# Altium footprint library EXPLORER.PcbLib: 252 footprints (part 11 of 16)
Each footprint in its own frame and in the unit in brackets; x right, y up, seen from the top. Pads: shape width x height; smd on the part's side, far side on the other; paste and mask are expansions set on the pad; w line width, h text height; cw(c..) or ccw(c..) is an arc to the next point about the centre after c.
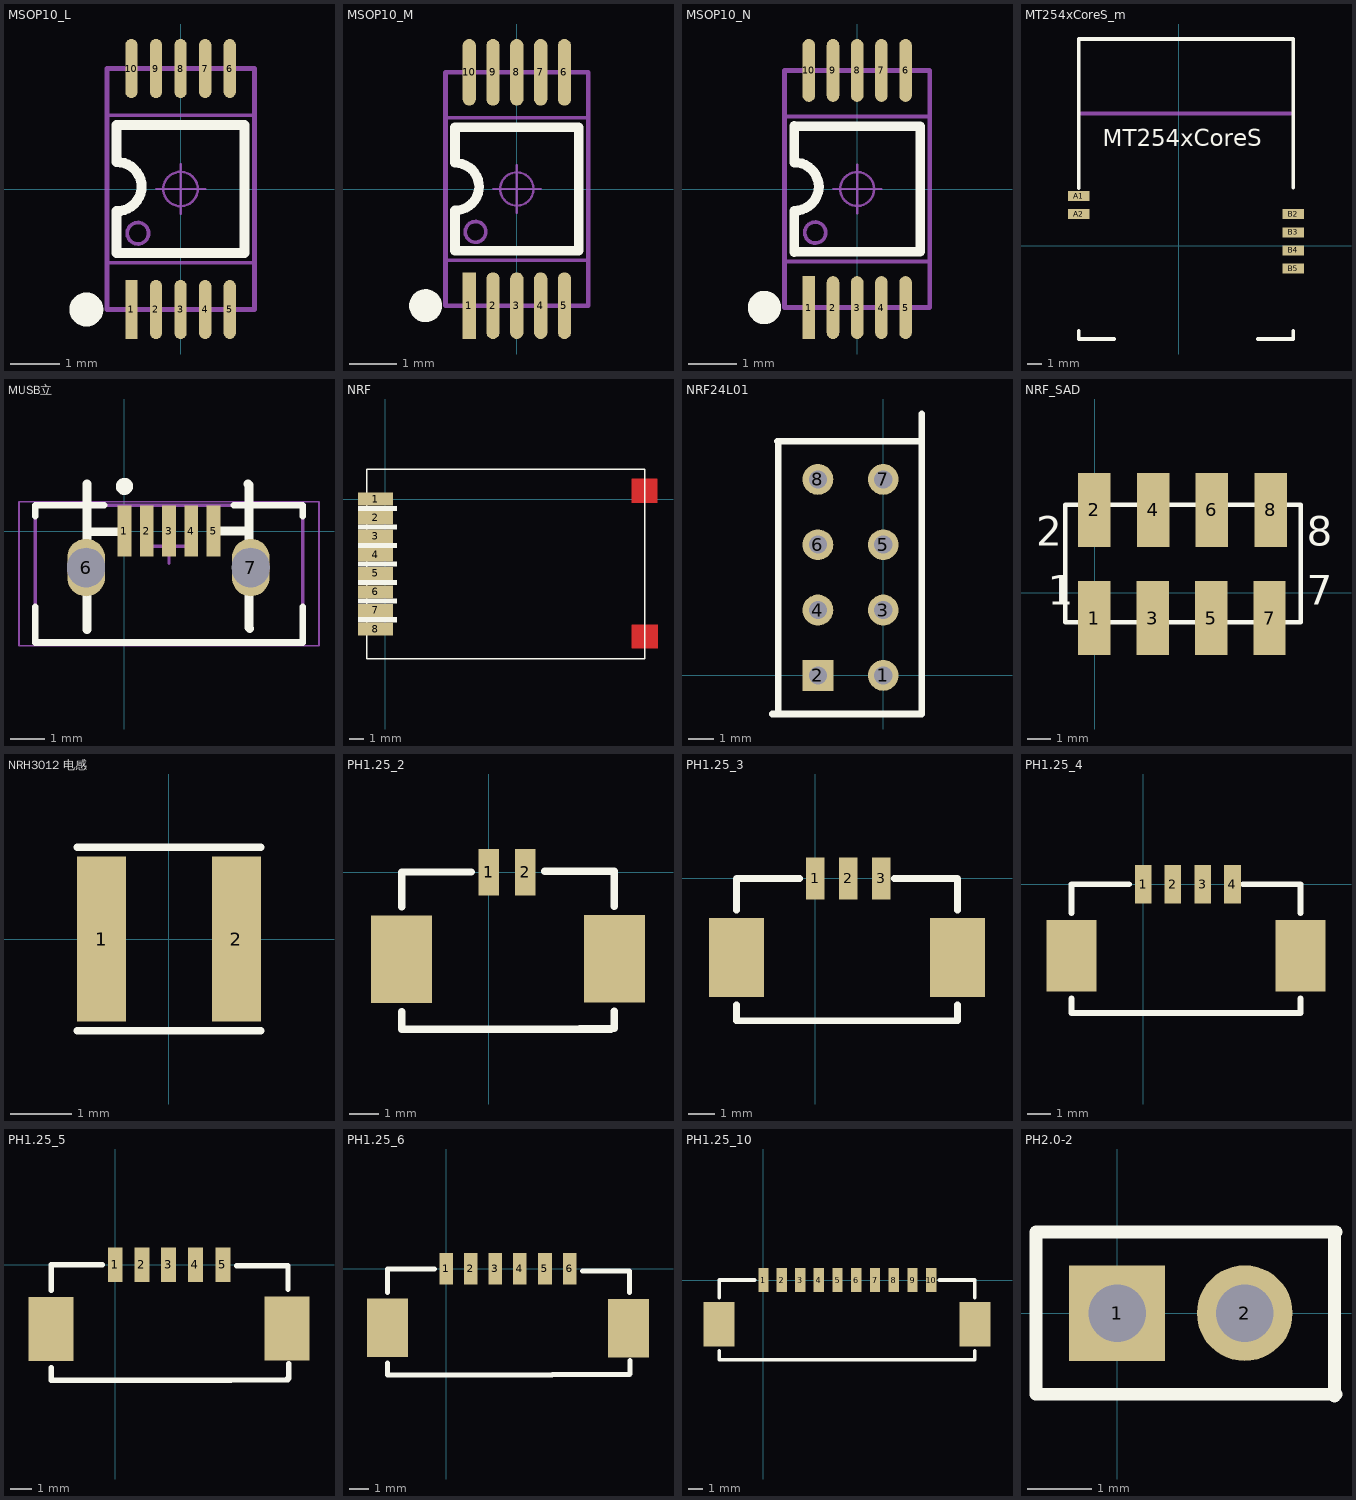
[diagram p10: the footprints below, top view; thin cyan lines are the x and y axes]

## MSOP10_L [mm] "塑封体长3mm，宽3mm，脚距0.5"
pads (10):
  rect 0.25x1.2 smd: 1(-1,-2.45)
  oval 0.25x1.2 smd: 2(-0.5,-2.45) 3(0,-2.45) 4(0.5,-2.45) 5(1,-2.45) 6(1,2.45) 7(0.5,2.45) 8(0,2.45) 9(-0.5,2.45) 10(-1,2.45)
Top Overlay:
  circle w0.381: c-1.917,-2.45 r0.155
  lines w0.2: -1.3,-1.3 1.3,-1.3 1.3,1.3 -1.3,1.3
  lines w0.203: -1.3,-1.3 -1.3,-0.46 ; -1.3,-0.45 ccw(c-1.3,0.058) -0.792,0.058 ; -1.3,0.55 cw(c-1.3,0.042) -0.792,0.042 ; -1.3,0.556 -1.3,1.3
Mechanical 13:
  circle w0.076: c-0.867,-0.9 r0.217
  lines w0.076: -1.5,-1.5 -1.5,1.5 1.5,1.5 1.5,-1.5 -1.5,-1.5
Mechanical 15:
  circle w0.05: c0,0 r0.35
  lines w0.05: -0.5,0 0.5,0 ; 0,-0.5 0,0.5
  lines w0.1: -1.5,-2.45 1.5,-2.45 1.5,2.45 -1.5,2.45 -1.5,-2.45
3D body: height 0.95, standoff 0, extent -1.5,-2.45 1.5,2.45

## MSOP10_M [mm] "塑封体长3mm，宽3mm，脚距0.5"
pads (10):
  rect 0.28x1.4 smd: 1(-1,-2.45)
  oval 0.28x1.4 smd: 2(-0.5,-2.45) 3(0,-2.45) 4(0.5,-2.45) 5(1,-2.45) 6(1,2.45) 7(0.5,2.45) 8(0,2.45) 9(-0.5,2.45) 10(-1,2.45)
Top Overlay:
  circle w0.381: c-1.917,-2.45 r0.155
  lines w0.2: -1.3,-1.3 1.3,-1.3 1.3,1.3 -1.3,1.3
  lines w0.203: -1.3,-1.3 -1.3,-0.46 ; -1.3,-0.45 ccw(c-1.3,0.058) -0.792,0.058 ; -1.3,0.55 cw(c-1.3,0.042) -0.792,0.042 ; -1.3,0.556 -1.3,1.3
Mechanical 13:
  circle w0.076: c-0.867,-0.9 r0.217
  lines w0.076: -1.5,-1.5 -1.5,1.5 1.5,1.5 1.5,-1.5 -1.5,-1.5
Mechanical 15:
  circle w0.05: c0,0 r0.35
  lines w0.05: -0.5,0 0.5,0 ; 0,-0.5 0,0.5
  lines w0.1: -1.5,-2.45 1.5,-2.45 1.5,2.45 -1.5,2.45 -1.5,-2.45
3D body: height 0.95, standoff 0, extent -1.5,-2.45 1.5,2.45

## MSOP10_N [mm] "塑封体长3mm，宽3mm，脚距0.5"
pads (10):
  rect 0.26x1.3 smd: 1(-1,-2.45)
  oval 0.26x1.3 smd: 2(-0.5,-2.45) 3(0,-2.45) 4(0.5,-2.45) 5(1,-2.45) 6(1,2.45) 7(0.5,2.45) 8(0,2.45) 9(-0.5,2.45) 10(-1,2.45)
Top Overlay:
  circle w0.381: c-1.917,-2.45 r0.155
  lines w0.2: -1.3,-1.3 1.3,-1.3 1.3,1.3 -1.3,1.3
  lines w0.203: -1.3,-1.3 -1.3,-0.46 ; -1.3,-0.45 ccw(c-1.3,0.058) -0.792,0.058 ; -1.3,0.55 cw(c-1.3,0.042) -0.792,0.042 ; -1.3,0.556 -1.3,1.3
Mechanical 13:
  circle w0.076: c-0.867,-0.9 r0.217
  lines w0.076: -1.5,-1.5 -1.5,1.5 1.5,1.5 1.5,-1.5 -1.5,-1.5
Mechanical 15:
  circle w0.05: c0,0 r0.35
  lines w0.05: -0.5,0 0.5,0 ; 0,-0.5 0,0.5
  lines w0.1: -1.5,-2.45 1.5,-2.45 1.5,2.45 -1.5,2.45 -1.5,-2.45
3D body: height 0.95, standoff 0, extent -1.5,-2.45 1.5,2.45

## MT254xCoreS_m [mm] "CC2540/41-PCB-SMT-package"
height 1.6
pads (6):
  rect 1.5x0.7 smd: A1(-6.992,3.48) A2(-6.992,2.21) B2(8.008,2.21) B3(8.008,0.94) B4(8.008,-0.33) B5(8.008,-1.6)
Top Overlay:
  lines w0.254: -6.992,-5.969 -6.992,-6.528 -4.503,-6.528 ; -6.992,4.039 -6.992,14.472 8.008,14.472 8.008,4.053 ; 5.53,-6.528 8.008,-6.528 8.008,-5.955
  text "MT254xCoreS" at -5.334,6.528 h2.03
Mechanical 15:
  lines w0.254: -6.992,9.255 8.001,9.255
3D body: height 1.42, standoff -0.02, extent -7.017,-6.477 7.969,14.503

## MUSB立 [mm] "USB, Micro B, Body 7.8x4mm, Pitch 0.65mm"
height 6.5
pads (7):
  rect 0.4x1.5 smd: 1(0,0) 2(0.65,0) 3(1.3,0) 4(1.95,0) 5(2.6,0)
  oval 1.1x1.68 hole 1.1 slot 1.15 at 90 deg: 6(-1.118,-1.067) 7(3.683,-1.067)
Top Overlay:
  circle w0.25: c0,1.3 r0.125
  lines w0.2: -2.6,-2.216 -2.6,-3.25 5.2,-3.25 5.2,-2.216 ; -2.6,0.436 -2.6,0.75 -0.6,0.75 ; 3.2,0.75 5.2,0.75 5.2,0.436
  lines w0.254: -1.092,-2.87 -1.092,0.356 ; -1.092,1.372 -1.092,-0.025 0,-0.025 ; 2.616,0 3.632,0 3.632,1.346 3.607,1.372 ; 3.632,0.051 3.632,-2.819 3.658,-2.845
Mechanical 13:
  lines w0.1: -2.6,-3.25 5.2,-3.25 5.2,0.75 -2.6,0.75 -2.6,-3.25
Mechanical 15:
  lines w0.05: -3.075,-3.35 -3.075,0.85 5.675,0.85 5.675,-3.35 -3.075,-3.35
  lines w0.1: 0.8,-0.445 1.8,-0.445 ; 1.3,-0.945 1.3,0.055
3D body: height 6.55, standoff -2.25, extent -2.6,-3.25 5.202,0.75

## NRF [mm]
pads (8):
  rect 2.4x0.9 smd: 1(-0.66,0) 2(-0.66,-1.27) 3(-0.66,-2.54) 4(-0.66,-3.81) 5(-0.66,-5.08) 6(-0.66,-6.35) 7(-0.66,-7.62) 8(-0.66,-8.89)
Top Layer:
  rectangle: 16.84,-0.254 18.644,1.397
  rectangle: 16.866,-10.236 18.669,-8.585
Top Overlay:
  region: -1.87,-8.08 -1.87,-8.43 0.8,-8.43 0.8,-8.08
  region: -1.87,-6.81 -1.87,-7.16 0.8,-7.16 0.8,-6.81
  region: -1.87,-5.54 -1.87,-5.89 0.8,-5.89 0.8,-5.54
  region: -1.87,-4.27 -1.87,-4.62 0.8,-4.62 0.8,-4.27
  region: -1.87,-3 -1.87,-3.35 0.8,-3.35 0.8,-3
  region: -1.87,-1.73 -1.87,-2.08 0.8,-2.08 0.8,-1.73
  region: -1.87,-0.46 -1.87,-0.81 0.8,-0.81 0.8,-0.46
  lines w0.1: -1.25,-10.94 -1.25,2.06 17.75,2.06 17.75,-10.94 -1.25,-10.94
Bottom Overlay:
  region: -1.87,-8.08 -1.87,-8.43 0.8,-8.43 0.8,-8.08
  region: -1.87,-6.81 -1.87,-7.16 0.8,-7.16 0.8,-6.81
  region: -1.87,-5.54 -1.87,-5.89 0.8,-5.89 0.8,-5.54
  region: -1.87,-4.27 -1.87,-4.62 0.8,-4.62 0.8,-4.27
  region: -1.87,-3 -1.87,-3.35 0.8,-3.35 0.8,-3
  region: -1.87,-1.73 -1.87,-2.08 0.8,-2.08 0.8,-1.73
  region: -1.87,-0.46 -1.87,-0.81 0.8,-0.81 0.8,-0.46
Top Solder:
  rectangle: 16.84,-0.254 18.618,1.422
  rectangle: 16.866,-10.236 18.644,-8.56

## NRF24L01 [mm]
pads (8):
  round 1.2 hole 0.7: 1(0,0) 3(0,2.54) 4(-2.54,2.54) 5(0,5.08) 6(-2.54,5.08) 7(0,7.62) 8(-2.54,7.62)
  rect 1.2x1.2 hole 0.7: 2(-2.54,0)
Top Overlay:
  lines w0.254: -4.318,-1.5 1.5,-1.5 1.5,10.16 ; -4.089,-1.5 -4.089,9.068 -4.115,9.093 1.5,9.093

## NRF_SAD [mm] "Connector; Header; 4x2 Position"
pads (8):
  rect 1.4x3.2 smd: 1(-0.025,-1.092) 2(-0.025,3.581) 3(2.498,-1.092) 4(2.515,3.581) 5(5.021,-1.092) 6(5.055,3.581) 7(7.544,-1.092) 8(7.595,3.581)
Top Overlay:
  lines w0.2: -1.27,-1.27 -1.27,3.81 8.89,3.81 8.89,-1.27 -1.27,-1.27
  text "8" at 9.144,2.032 h1.27
  text "7" at 9.144,-0.508 h1.27
  text "1" at -2.032,-0.508 h1.27
  text "2" at -2.54,2.032 h1.27

## NRH3012 电感 [mm]
pads (2):
  rect 0.8x2.7 smd: 1(-1.1,0) 2(1.1,0)
Top Overlay:
  lines w0.125: -1.5,-1.5 1.5,-1.5 ; -1.5,1.5 1.5,1.5

## PH1.25_2 [mm]
pads (4):
  rect 0.7x1.6 smd: 1(0,0) 2(1.25,0)
  rect 2.1x3 smd: ""(-3,-3) ""(4.314,-2.975)
Top Overlay:
  lines w0.25: -3,-4.8 -3,-5.4 4.191,-5.4 ; -3,-1.2 -3,0 -0.6,0 ; 1.914,0.025 4.314,0.025 4.314,-1.175 ; 3.114,-5.375 4.314,-5.375 4.314,-4.775

## PH1.25_3 [mm]
pads (5):
  rect 0.7x1.6 smd: 1(0,0) 2(1.25,0) 3(2.5,0)
  rect 2.1x3 smd: ""(-3,-3) ""(5.4,-3)
Top Overlay:
  lines w0.25: -3,-4.8 -3,-5.4 5.4,-5.4 5.4,-4.8 ; -3,-1.2 -3,0 -0.6,0 ; 3,0 5.4,0 5.4,-1.2

## PH1.25_4 [mm]
pads (6):
  rect 0.7x1.6 smd: 1(0,0) 2(1.25,0) 3(2.5,0) 4(3.75,0)
  rect 2.1x3 smd: ""(-3,-3) ""(6.6,-3)
Top Overlay:
  lines w0.25: -3,-4.8 -3,-5.4 5.4,-5.4 6.6,-5.4 6.6,-4.8 ; -3,-1.2 -3,0 -0.6,0 ; 4.2,0 6.6,0 6.6,-1.2

## PH1.25_5 [mm]
pads (7):
  rect 0.7x1.6 smd: 1(0,0) 2(1.25,0) 3(2.5,0) 4(3.75,0) 5(5.029,0)
  rect 2.1x3 smd: ""(-3,-3) ""(8.026,-2.972)
Top Overlay:
  lines w0.25: -3,-4.8 -3,-5.4 5.4,-5.4 ; -3,-1.2 -3,0 -0.6,0 ; 5.677,-0.051 8.077,-0.051
  lines w0.254: 5.41,-5.385 8.077,-5.385 ; 8.052,-5.334 8.103,-5.309 8.103,-4.623 ; 8.077,-1.143 8.077,-0.051

## PH1.25_6 [mm]
pads (8):
  rect 0.7x1.6 smd: 1(0,0) 2(1.25,0) 3(2.5,0) 4(3.75,0) 5(5.029,0) 6(6.299,0)
  rect 2.1x3 smd: ""(-3,-3) ""(9.296,-3.023)
Top Overlay:
  lines w0.25: -3,-4.8 -3,-5.4 5.4,-5.4 ; -3,-1.2 -3,0 -0.6,0 ; 6.947,-0.102 9.347,-0.102
  lines w0.254: 5.41,-5.385 9.322,-5.385 9.373,-5.359 9.373,-4.674 ; 9.347,-1.194 9.347,-0.102

## PH1.25_10 [mm]
pads (12):
  rect 0.7x1.6 smd: 1(0,0) 2(1.25,0) 3(2.5,0) 4(3.75,0) 5(5.02,0) 6(6.29,0) 7(7.56,0) 8(8.83,0) 9(10.1,0) 10(11.37,0)
  rect 2.1x3 smd: ""(-3,-3) ""(14.322,-3)
Top Overlay:
  lines w0.25: -3,-4.8 -3,-5.4 13.284,-5.4 ; -3,-1.2 -3,0 -0.6,0 ; 11.922,0 14.322,0 14.322,-1.2 ; 13.122,-5.4 14.322,-5.4 14.322,-4.8

## PH2.0-2 [mm]
pads (2):
  rect 1.5x1.5 hole 0.9: 1(0,0)
  round 1.5 hole 0.9: 2(2,0)
Top Overlay:
  lines w0.2: 3.404,-1.295 3.404,1.245 ; 3.429,-1.27 -1.27,-1.27 -1.27,1.27 3.429,1.27